# Altium schematic symbol library AA_Symbols.SchLib: 1017 symbols (part 2 of 7) (continued)
## Con_Header_50_V_SHRD_STRN-RLF_EJCT_SMT
designator P?, comment EHT-125-01-L-D-SM-SR
Connector, Header, 25x2Position, Vertical, Shrowded, Strain Relief, Eject Hooks, Surface Mount; Manufacturer: Samtec; Outset P/N: PN-0001709; Value: EHT-125-01-L-D-SM-SR; Manufacturer P/N: EHT-125-01-L-D-SM-SR
footprint EHT-125-01-L-D-SM-SR-LC_2mm2x25pin (Connector, Header, 25x2Position, Vertical, Shrowded, Eject Hooks, Surface Mount)
footprint EHT-125-01-L-D-SM-SR_2mm2x25pin (Connector, Header, 25x2Position, Vertical, Shrowded, Eject Hooks, Surface Mount)
pins: 1, 2, 3, 4, 5, 6, 7, 8, 9, 10, 11, 12, 13, 14, 15, 16, 17, 18, 19, 20, 21, 22, 23, 24, 25, 26, 27, 28, 29, 30, 31, 32, 33, 34, 35, 36, 37, 38, 39, 40, 41, 42, 43, 44, 45, 46, 47, 48, 49, 50

## Con_MicroClasp_Dual_8_V_Thru
designator J?, comment 55917-0810
Connector, MicroClasp, Dual Row, 8 Position, Vertical, Through Hole; Manufacturer: Molex; Outset P/N: 0000056; Manufacturer P/N: 55917-0810
footprint 55917-0810 (Connector, MicroClasp, Dual Row, 8 Position, Vertical, Through Hole)
pins: 1, 2, 3, 4, 5, 6, 7, 8

## Con_MicroClasp_Dual_10_V_Thru
designator J?, comment 55917-1010
Connector, MicroClasp, Dual Row, 10 Position, Vertical, Through Hole; Manufacturer: Molex; Outset P/N: 0000049; Manufacturer P/N: 55917-1010
footprint 55917-1010 (Connector, MicroClasp, Dual Row, 10 Position, Vertical, Through Hole)
pins: 1, 2, 3, 4, 5, 6, 7, 8, 9, 10

## Con_MicroClasp_Dual_14_V_Thru
designator J?, comment 55917-1410
Connector, MicroClasp, Dual Row, 14 Position, Vertical, Through Hole; Manufacturer: Molex; Outset P/N: 0000050; Manufacturer P/N: 55917-1410
footprint 55917-1410 (Connector, MicroClasp, Dual Row, 14 Position, Vertical, Through Hole)
pins: 1, 2, 3, 4, 5, 6, 7, 8, 9, 10, 11, 12, 13, 14

## Con_MicroClasp_Dual_18_V_Thru
designator J?, comment 55917-1810
Connector, MicroClasp, Dual Row, 18 Position, Vertical, Through Hole; Manufacturer: Molex; Outset P/N: 0000051; Manufacturer P/N: 55917-1810
footprint 55917-1810 (Connector, MicroClasp, Dual Row, 18 Position, Vertical, Through Hole)
pins: 1, 2, 3, 4, 5, 6, 7, 8, 9, 10, 11, 12, 13, 14, 15, 16, 17, 18

## Con_MicroClasp_Dual_20_V_Thru
designator J?, comment 55917-2010
Connector, MicroClasp, Dual Row, 20 Position, Vertical, Through Hole; Manufacturer: Molex; Outset P/N: 0000052; Manufacturer P/N: 55917-2010
footprint 55917-2010 (Connector, MicroClasp, Dual Row, 20 Position, Vertical, Through Hole)
pins: 1, 2, 3, 4, 5, 6, 7, 8, 9, 10, 11, 12, 13, 14, 15, 16, 17, 18, 19, 20

## Con_MicroClasp_Dual_28_V_Thru
designator J?, comment 55917-2810
Connector, MicroClasp, Dual Row, 28 Position, Vertical, Through Hole; Manufacturer: Molex; Outset P/N: 0000053; Manufacturer P/N: 55917-2810
footprint 55917-2810 (Connector, MicroClasp, Dual Row, 28 Position, Vertical, Through Hole)
pins: 1, 2, 3, 4, 5, 6, 7, 8, 9, 10, 11, 12, 13, 14, 15, 16, 17, 18, 19, 20, 21, 22, 23, 24, 25, 26, 27, 28

## Con_MicroClasp_Dual_34_V_Thru
designator J?, comment 55917-3410
Connector, MicroClasp, Dual Row, 34 Position, Vertical, Through Hole; Manufacturer: Molex; Outset P/N: 0000054; Manufacturer P/N: 55917-3410
footprint 55917-3410 (Connector, MicroClasp, Dual Row, 34 Position, Vertical, Through Hole)
pins: 1, 2, 3, 4, 5, 6, 7, 8, 9, 10, 11, 12, 13, 14, 15, 16, 17, 18, 19, 20, 21, 22, 23, 24, 25, 26, 27, 28, 29, 30, 31, 32, 33, 34

## Con_MicroClasp_Dual_40_V_Thru
designator J?, comment 55917-4010
Connector, MicroClasp, Dual Row, 40 Position, Vertical, Through Hole; Manufacturer: Molex; Outset P/N: 0000055; Manufacturer P/N: 55917-4010
footprint 55917-4010 (Connector, MicroClasp, Dual Row, 40 Position, Vertical, Through Hole)
pins: 1, 2, 3, 4, 5, 6, 7, 8, 9, 10, 11, 12, 13, 14, 15, 16, 17, 18, 19, 20, 21, 22, 23, 24, 25, 26, 27, 28, 29, 30, 31, 32, 33, 34, 35, 36, 37, 38, 39, 40

## Con_MicroFit_2_RA_Thru
designator J?, comment 43045-0201
Connector, Micro-Fit, 2 Position, Right Angle, Through Hole; Manufacturer: Molex; Outset P/N: 0000061; Manufacturer P/N: 43045-0201
footprint 43045-0201
pins: 1, 2

## Con_MicroFit_2_V_Thru
designator J?, comment 43045-0228
Connector, Micro-Fit, 2 Position, Vert, Through Hole; Manufacturer: Molex; Outset P/N: 0000062; Manufacturer P/N: 43045-0228
footprint 43045-0228 (Conn, 2-Pin, Vertical Thru-hole, Molex Micro-Fit)
pins: 1, 2

## Con_MicroFit_4_RA_Thru
designator J?, comment 43045-0401
Connector, Micro-Fit, 4 Position, Right Angle, Through Hole; Manufacturer: Molex; Outset P/N: 0000063; Manufacturer P/N: 43045-0401
footprint 43045-0401 (Conn, 4-Pin, Right Angle, Thru-hole, Molex Micro-Fit)
pins: 1, 2, 3, 4

## Con_MicroFit_4_V_SMT
designator J?, comment 43045-0419
Connector, Micro-Fit, 4 Position, Vertical, SMT; Manufacturer: Molex; Outset P/N: 0000064; Manufacturer P/N: 43045-0419
footprint 43045-0419 (Conn, 4-Pin, Vertical, SMT, Molex Micro-Fit)
pins: 1, 2, 3, 4

## Con_MicroFit_4_V_Thru
designator J?, comment 43045-0428
Connector, Micro-Fit, 4 Position, Vertical, Through Hole; Manufacturer: Molex; Outset P/N: 0000065; Manufacturer P/N: 43045-0428
footprint 43045-0428 (Conn, 4-Pin, Vertical Thru-hole, Molex Micro-Fit)
pins: 1, 2, 3, 4

## Con_MicroFit_6_RA_Thru
designator J?, comment 43045-0601
Connector, Micro-Fit, 6 Position, Right Angle, Through Hole; Manufacturer: Molex; Outset P/N: 0000066; Manufacturer P/N: 43045-0601
footprint 43045-0601 (Conn, 6-Pin, Right Angle, Thru-hole, Molex Micro-Fit)
pins: 1, 2, 3, 4, 5, 6

## Con_MicroFit_6_V_Thru
designator J?, comment 43045-0628
Connector, Micro-Fit, 6 Position, Vertical, Through Hole; Manufacturer: Molex; Outset P/N: 0000067; Manufacturer P/N: 43045-0628
footprint 43045-0628 (Conn, 6-Pin, Vertical, Molex Micro-Fit)
pins: 1, 2, 3, 4, 5, 6

## Con_MicroFit_8_RA_Thru
designator J?, comment 43045-0801
Connector, Micro-Fit, 8 Position, Right Angle, Through Hole; Manufacturer: Molex; Outset P/N: 0000068; Manufacturer P/N: 43045-0801
footprint 43045-0801 (Conn, 8-Pin, Right Angle, Thru-hole, Molex Micro-Fit)
pins: 1, 2, 3, 4, 5, 6, 7, 8

## Con_MicroFit_10_RA_Thru
designator J?, comment 43045-1001
Connector, Micro-Fit, 10 Position, Right Angle, Through Hole; Manufacturer: Molex; Outset P/N: 0000057; Manufacturer P/N: 43045-1001
footprint 43045-1001 (Conn, 10-Pin, Right Angle, Thru-hole, Molex Micro-Fit)
pins: 1, 2, 3, 4, 5, 6, 7, 8, 9, 10

## Con_MicroFit_10_V_Thru
designator J?, comment 43045-1028
Connector, Micro-Fit, 10 Position, Vertical, Through Hole; Manufacturer: Molex; Outset P/N: 0000058; Manufacturer P/N: 43045-1028
footprint 43045-1028 (Conn, 10-Pin, Right Angle, Vertical, Molex Micro-Fit)
pins: 1, 2, 3, 4, 5, 6, 7, 8, 9, 10

## Con_MicroFit_Single_6_V_Thru
designator J?, comment 43650-0628
Connector, Micro-Fit, Single Row, 6 Position, Vertical, Through Hole; Manufacturer: Molex; Outset P/N: 0000069; Manufacturer P/N: 43650-0628
footprint 43650-0628 (Conn, 6-Pin, Single Row, Vertical, Molex Micro-Fit)
pins: 1, 2, 3, 4, 5, 6

## Con_microSD_8_HINGE
designator J?, comment 5009010801
Connector, microSD Memory Card Connector, 8 Positions, Hinge Style; Manufacturer: Molex; Outset P/N: PN-0001737; Manufacturer P/N: 5009010801; Value: 5009010801
footprint 5009010801_microSD_8pin (Footprint not found)
pins: 1 DAT2, 2 CD/DAT3, 3 CMD, 4 VDD, 5 CLK, 6 GND, 7 DAT0, 8 DAT1, 9 SHELL1, 10 SHELL2, 11 SHELL3, 12 SHELL4
text: LOCK; microSD card / topside; OPEN

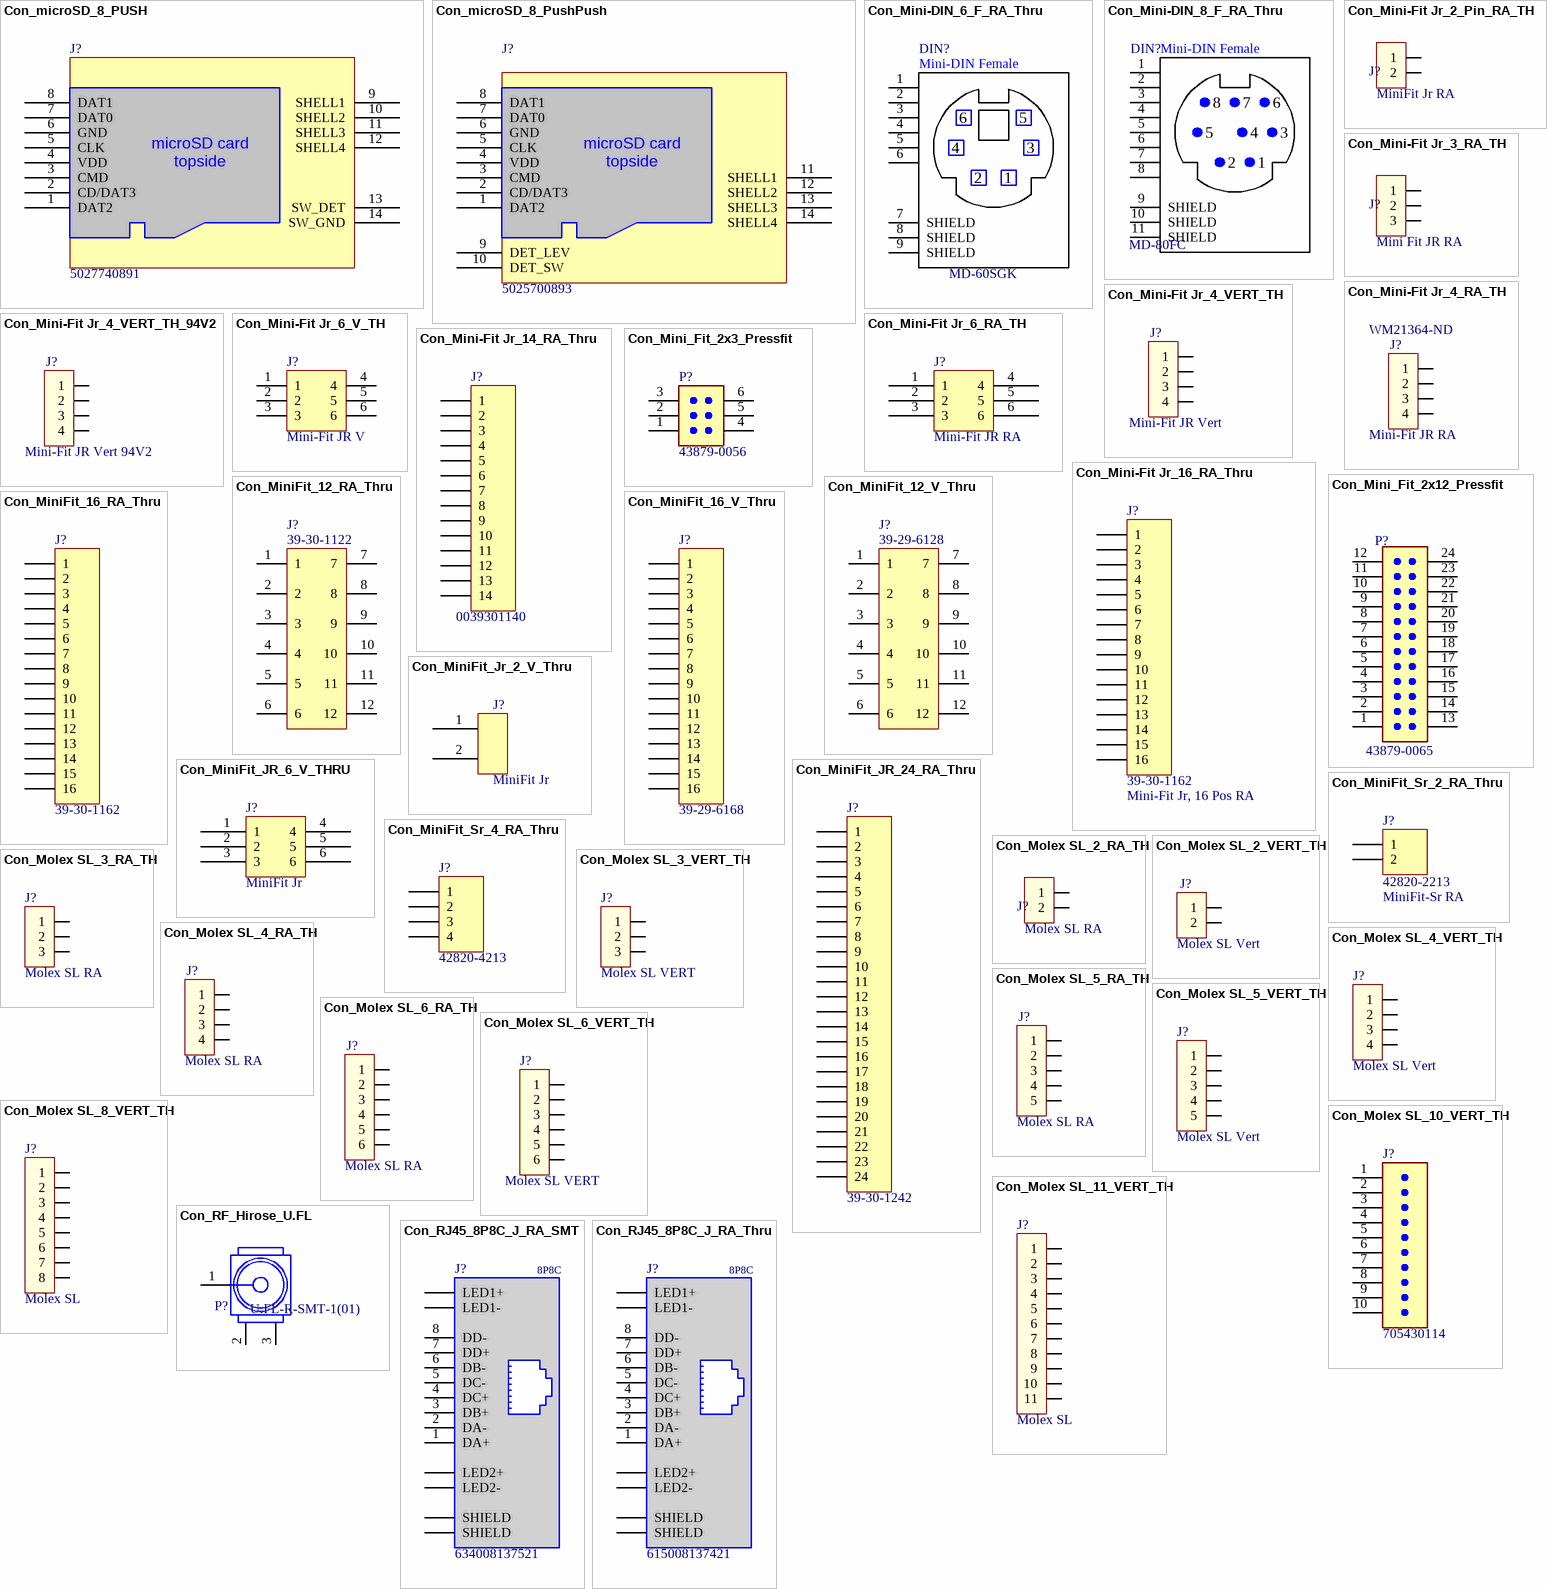
[diagram p9: symbols Con_microSD_8_PUSH to Con_RJ45_8P8C_J_RA_Thru]

## Con_microSD_8_PUSH
designator J?, comment 5027740891
Connector, microSD Memory Card Connector, 8 Positions, Hinge Style; Manufacturer PN: 5027740891; Value: 5027740891
footprint CONN_SD_5027740891 (ONN MICRO SD CARD PUSH-PUSH R/A)
pins: 1 DAT2, 2 CD/DAT3, 3 CMD, 4 VDD, 5 CLK, 6 GND, 7 DAT0, 8 DAT1, 9 SHELL1, 10 SHELL2, 11 SHELL3, 12 SHELL4, 13 SW_DET, 14 SW_GND
text: microSD card / topside

## Con_microSD_8_PushPush
designator J?, comment 5025700893
Connector, microSD Memory Card Connector, 8 Positions, Push-Push; Manufacturer: Molex; Manufacturer P/N: 5025700893; Value: 5025700893
footprint 5025700893_microSD_8pin
pins: 1 DAT2, 2 CD/DAT3, 3 CMD, 4 VDD, 5 CLK, 6 GND, 7 DAT0, 8 DAT1, 9 DET_LEV, 10 DET_SW, 11 SHELL1, 12 SHELL2, 13 SHELL3, 14 SHELL4
text: microSD card / topside

## Con_Mini-DIN_6_F_RA_Thru
designator DIN?, comment MD-60SGK
Connector, Mini DIN, 6 Positions, Female, Right Angle, Through Hole; Manufacturer: CUI; Outset P/N: PN-0001674; Manufacturer P/N: MD-60SGK; Value: MD-60SGK
footprint MD-60SGK_2.6mm6pin (CUI Mini-DIN 6 Poisition,  Female, Shielded, Right Angle)
pins: 1, 2, 3, 4, 5, 6, 7 SHIELD, 8 SHIELD, 9 SHIELD
text: Mini-DIN Female

## Con_Mini-DIN_8_F_RA_Thru
designator DIN?, comment MD-80FC
Connector, Mini DIN, 8 Positions, Female, Right Angle, Through Hole; Manufacturer: CUI; Outset P/N: PN-0001627; Manufacturer P/N: MD-80FC; Value: MD-80FC
footprint MD-80FC_2.6mm8pin (MD-80FC, Mini-DIN 8 Poisition Connector, Female, Right Angle)
pins: 1, 2, 3, 4, 5, 6, 7, 8, 9 SHIELD, 10 SHIELD, 11 SHIELD
text: Mini-DIN Female

## Con_Mini-Fit Jr_2_Pin_RA_TH
designator J?, comment MiniFit Jr RA
Connector, Mini-Fit Jr, 2 Pin, Right Angle, Thru-Hole; Manufacturer: Molex; Manufacturer P/N: 0039301022; Outset P/N: PN-0002158; Supplier 1: Digi-Key; Supplier Part Number 1: WM21363-ND; Value: MiniFit Jr RA
footprint 39-30-1022 (Footprint not found)
pins: 1, 2

## Con_Mini-Fit Jr_3_RA_TH
designator J?, comment Mini Fit JR RA
Connector, Mini-Fit Jr, 3 Pin_Right Angle, Thru-Hole; Manufacturer: Molex; Manufacturer P/N: 0039303038; Outset P/N: PN-0002160; Supplier 1: Digi-Key; Supplier Part Number 1: WM4273-ND; Value: Mini Fit JR RA
footprint 39-30-3038 (Footprint not found)
pins: 1, 2, 3

## Con_Mini-Fit Jr_4_RA_TH
designator J?, comment Supplier Part Number 1: WM21364-ND  (hidden comment: Mini-Fit JR RA)
Connector, Mini-Fit Jr, 4 Pin, Right Angle, Thru-Hole; Manufacturer: Molex; Manufacturer P/N: 0039301042; Outset P/N: PN-0002984; Supplier 1: Digi-Key; Value: Mini-Fit JR RA
footprint 39-30-1042 (4 Positions Header, Shrouded Connector 0.165" (4.20mm) Through Hole Gold)
pins: 1, 2, 3, 4

## Con_Mini-Fit Jr_4_VERT_TH
designator J?, comment Mini-Fit JR Vert
Connector, Mini-Fit Jr, 4 Pin, Vertical, Thru-Hole; Manufacturer: Molex; Manufacturer P/N: 0039299049; Outset P/N: PN-0002161; Supplier 1: Digi-Key; Supplier Part Number 1: -; Value: Mini-Fit JR Vert
footprint 39-29-9049 (4 Positions Header, Shrouded Connector 0.165" (4.20mm) Through Hole Gold)
pins: 1, 2, 3, 4

## Con_Mini-Fit Jr_4_VERT_TH_94V2
designator J?, comment Mini-Fit JR Vert 94V2
Connector, Mini-Fit Jr, 4 Pin, Vertical, Thru-Hole 94V2; Manufacturer: Molex; Manufacturer P/N: 0039299044; Outset P/N: PN-0001800; Supplier 1: Digi-Key; Supplier Part Number 1: -; Value: Mini-Fit JR Vert 94V2
footprint 39-29-9049 (4 Positions Header, Shrouded Connector 0.165" (4.20mm) Through Hole Gold)
pins: 1, 2, 3, 4

## Con_Mini-Fit Jr_6_RA_TH
designator J?, comment Mini-Fit JR RA
Connector, Mini-Fit Jr, 6 Pin, Right Angle, Thru-Hole; Manufacturer: Molex; Manufacturer P/N: 0039301062; Outset P/N: PN-0002162; Supplier 1: Digi-Key; Supplier Part Number 1: WM21365-ND; Value: Mini-Fit JR RA
footprint 39-30-1062 (MiniFit Jr 6 pin RA)
pins: 1, 2, 3, 4, 5, 6

## Con_Mini-Fit Jr_6_V_TH
designator J?, comment Mini-Fit JR V
Connector, Mini-Fit Jr, 6 Pin, Right Angle, Thru-Hole; Manufacturer: Molex; Manufacturer P/N: 0462070206; Supplier 1: Digi-Key; Supplier Part Number 1: 0462070206-ND; Value: Mini-Fit JR V
footprint CONN_TH_MOLEX_0462070206 (Molex Mini-Fit Jr High-Temp, Vertical, 2x3-pin, 4.2mm pitch, with mounting tabs)
pins: 1, 2, 3, 4, 5, 6

## Con_Mini-Fit Jr_14_RA_Thru
designator J?, comment value 0039301140  (hidden comment: 39-30-1140)
Connector, Mini-Fit Jr, 14 Position, Right Angle, Through Hole; Manufacturer: Molex; Outset P/N: PN-0007482; Distributor: Digi-Key; Distributor P/N: WM1357-ND; Manufacturer P/N: 0039301140; Supplier 1: Digi-Key; Supplier Part Number 1: WM1357-ND
footprint 39-30-1140
pins: 1, 2, 3, 4, 5, 6, 7, 8, 9, 10, 11, 12, 13, 14

## Con_Mini-Fit Jr_16_RA_Thru
designator J?, comment 39-30-1162  value Mini-Fit Jr, 16 Pos RA
Connector, Mini-Fit Jr, 16 Position, Right Angle, Through Hole; Manufacturer: Molex; Outset P/N: 0000072; Distributor: Digi-Key; Distributor P/N: WM21370-ND; Manufacturer P/N: 39-30-1162; Supplier 1: Digi-Key; Supplier Part Number 1: WM21370-ND
footprint 39-30-1162
pins: 1, 2, 3, 4, 5, 6, 7, 8, 9, 10, 11, 12, 13, 14, 15, 16

## Con_Mini_Fit_2x3_Pressfit
designator P?, comment 43879-0056
Mini-Fit BMI Header , Dual Row, Vertical, 6 Circuits, Press-fit; Manufacturer: Molex; Outset P/N: PN-0001701; Manufacturer P/N: 43879-0056; Value: 43879-0056
footprint CONN_MOLEX_43879-0056 (Connector, Molex Mini-Fit BMI 2x3 Press-fit)
pins: 1, 2, 3, 4, 5, 6

## Con_Mini_Fit_2x12_Pressfit
designator P?, comment 43879-0065
Mini-Fit BMI Header , Dual Row, Vertical, 24 Circuits, Press-fit; Manufacturer: Molex; Outset P/N: PN-0001702; Manufacturer P/N: 43879-0065; Value: 43879-0065
footprint CONN_MOLEX_43879-0065 (Connector, Molex Mini-Fit BMI 2x12 Press-fit)
pins: 1, 2, 3, 4, 5, 6, 7, 8, 9, 10, 11, 12, 13, 14, 15, 16, 17, 18, 19, 20, 21, 22, 23, 24

## Con_MiniFit_12_RA_Thru
designator J?, comment 39-30-1122
Connector, Mini-Fit, 12 Position, Right Angle, Through Hole; Manufacturer: Molex; Outset P/N: 0000070; Manufacturer P/N: 39-30-1122
footprint CONN_MOLEX_39-30-X12X (2 X 6 PINS)
pins: 1, 2, 3, 4, 5, 6, 7, 8, 9, 10, 11, 12

## Con_MiniFit_12_V_Thru
designator J?, comment 39-29-6128
Connector, Mini-Fit, 12 Position, Vertical, Through Hole; Manufacturer: Molex; Outset P/N: 0000071; Manufacturer P/N: 39-29-6128
footprint CONN_MOLEX_39-29-6128 (Mini Fit JR, Vertical, 2 X 6 PINS)
pins: 1, 2, 3, 4, 5, 6, 7, 8, 9, 10, 11, 12

## Con_MiniFit_16_RA_Thru
designator J?, comment 39-30-1162
Connector, Mini-Fit, 16 Position, Right Angle, Through Hole; Manufacturer: Molex; Outset P/N: 0000072; Manufacturer P/N: 39-30-1162
footprint 26-01-3108
pins: 1, 2, 3, 4, 5, 6, 7, 8, 9, 10, 11, 12, 13, 14, 15, 16

## Con_MiniFit_16_V_Thru
designator J?, comment 39-29-6168
Connector, Mini-Fit Jr, 16 Position, Vertical, Through Hole; Manufacturer: Molex; Outset P/N: 0000073; Manufacturer P/N: 39-29-6168
footprint 039296168 (CONN HEADER MiniFit JR 16POS 4.2MM VERT GOL)
pins: 1, 2, 3, 4, 5, 6, 7, 8, 9, 10, 11, 12, 13, 14, 15, 16

## Con_MiniFit_Jr_2_V_Thru
designator J?, comment MiniFit Jr
Con, MiniFit-Jr, 2 Pin, Vert, Thru; Manufacturer: Molex; Outset P/N: 0000076; Manufacturer P/N: 39-29-9025
footprint Conn_2_Pin_Vert_Mini-Jr (MiniFit Jr 2 pin Vert)
pins: 1, 2

## Con_MiniFit_JR_6_V_THRU
designator J?, comment MiniFit Jr
Con, MiniFit Jr, 6 pins, Vert, Thru, 8A; Manufacturer: Molex; Outset P/N: 0000075; Manufacturer P/N: 39-29-0063
footprint CONN 6 PIN VERT MINI-JR
pins: 1, 2, 3, 4, 5, 6

## Con_MiniFit_JR_24_RA_Thru
designator J?, comment 39-30-1242
Connector, Mini-Fit JR, 24 Position, Right Angle, Through Hole; Manufacturer: Molex; Outset P/N: 0000074; Manufacturer P/N: 39-30-1242
footprint CONN_24_PIN_RA_MINIFIT-JR
pins: 1, 2, 3, 4, 5, 6, 7, 8, 9, 10, 11, 12, 13, 14, 15, 16, 17, 18, 19, 20, 21, 22, 23, 24

## Con_MiniFit_Sr_2_RA_Thru
designator J?, comment 42820-2213  value MiniFit-Sr RA
Connector, Mini-Fit Sr., 2 Position, Right Angle, Through Hole; Manufacturer: Molex; Outset P/N: 0000077; Manufacturer P/N: 42820-2213
footprint CON_2_RA_MiniFit_SR
pins: 1, 2

## Con_MiniFit_Sr_4_RA_Thru
designator J?, comment 42820-4213
Connector, Mini-Fit Sr., 4 Position, Right Angle, Through Hole; Manufacturer: Molex; Outset P/N: PN-0003041; Value: MiniFit-Sr RA; Supplier 1: Digi-Key; Supplier Part Number 1: WM10847-ND; Manufacturer P/N: 42820-4213
footprint 42820-4213 (CONN_4_RA_MiniFit_SR)
pins: 1, 2, 3, 4

## Con_Molex SL_2_RA_TH
designator J?, comment Molex SL RA
Connector, Molex SL, 2 Pin, Right Angle, Thru-Hole; Manufacturer P/N: 0705530001; Outset P/N: PN-0002164; Supplier 1: Digi-Key; Supplier Part Number 1: WM4900-ND; Manufacturer: Molex; Value: Molex SL RA
footprint 70553-0001 (Footprint not found)
pins: 1, 2

## Con_Molex SL_2_VERT_TH
designator J?, comment Molex SL Vert
Connector, Molex SL, 2 Pin, Vertical, Thru-Hole; Manufacturer P/N: 0705430106; Outset P/N: PN-0002165; Supplier 1: Digi-Key; Supplier Part Number 1: WM4122-ND; Manufacturer: Molex; Value: Molex SL Vert
footprint 70543-0106
pins: 1, 2

## Con_Molex SL_3_RA_TH
designator J?, comment Molex SL RA
Connector, Molex SL, 3 Pin, Vertical, Thru-Hole; Manufacturer P/N: 705530107; Outset P/N: PN-0002166; Supplier 1: Digi-Key; Supplier Part Number 1: WM4123-ND; Manufacturer: Molex; Value: Molex SL RA
footprint 70553-0107
pins: 1, 2, 3

## Con_Molex SL_3_VERT_TH
designator J?, comment Molex SL VERT
Connector, Molex SL, 3 Pin, Vertical, Thru-Hole; Manufacturer P/N: 0705430107; Outset P/N: PN-0002167; Supplier 1: Digi-Key; Supplier Part Number 1: WM4123-ND; Manufacturer: Molex; Value: Molex SL VERT
footprint 70543-0107
pins: 1, 2, 3

## Con_Molex SL_4_RA_TH
designator J?, comment Molex SL RA
Connector, Molex SL, 4 Pin, Right Angle, Thru-Hole; Manufacturer P/N: 705530108; Outset P/N: PN-0002168; Supplier 1: Digi-Key; Supplier Part Number 1: WM4155-ND; Manufacturer: Molex; Value: Molex SL RA
footprint 70553-0108
pins: 1, 2, 3, 4

## Con_Molex SL_4_VERT_TH
designator J?, comment Molex SL Vert
Connector, Molex SL, 4 Pin, Vertical, Thru-Hole; Manufacturer P/N: 0705430108; Outset P/N: PN-0002169; Supplier 1: Digi-Key; Supplier Part Number 1: WM4124-ND; Manufacturer: Molex; Value: Molex SL Vert
footprint 70543-0108
pins: 1, 2, 3, 4

## Con_Molex SL_5_RA_TH
designator J?, comment Molex SL RA
Connector, Molex SL, 5 Pin, Right Angle, Thru-Hole; Manufacturer P/N: 70553-0109; Outset P/N: PN-0002170; Manufacturer: Molex; Supplier 2: Element14; Supplier Part Number 2: 1450538; Value: Molex SL RA
footprint 70553-0109 (SL, 5pos, R/A, TH)
pins: 1, 2, 3, 4, 5

## Con_Molex SL_5_VERT_TH
designator J?, comment Molex SL Vert
Connector, Molex SL, 5 Pin, Vertical, Thru-Hole; Manufacturer P/N: 0705430109; Outset P/N: PN-0002171; Supplier 1: Digi-Key; Supplier Part Number 1: WM4125-ND; Manufacturer: Molex; Value: Molex SL Vert
footprint 70543-0109
pins: 1, 2, 3, 4, 5

## Con_Molex SL_6_RA_TH
designator J?, comment value Molex SL RA  (hidden comment: 70553-0110)
Connector, Molex SL, 6 Pin, Right Angle, Thru-Hole; Outset P/N: PN-0004065; Manufacturer: Molex; Manufacturer P/N: 70553-0110; Supplier 1: Digi-Key; Supplier Part Number 1: WM4157-ND
footprint 70553-0110 (SL, 6pos, R/A, TH)
pins: 1, 2, 3, 4, 5, 6

## Con_Molex SL_6_VERT_TH
designator J?, comment Molex SL VERT
Connector, Molex SL, 6 Pin, Vertical, Thru-Hole; Manufacturer P/N: 0705430110; Outset P/N: PN-0002173; Supplier 1: Digi-Key; Supplier Part Number 1: WM4126-ND; Manufacturer: Molex; Value: Molex SL VERT
footprint 70543-0110
pins: 1, 2, 3, 4, 5, 6

## Con_Molex SL_8_VERT_TH
designator J?, comment Molex SL
Connector, Molex SL, 8 Pin, Vertical, Thru-Hole; Manufacturer P/N: 0705430112; Outset P/N: PN-0002175; Value: Molex SL; Supplier 1: Digi-Key; Supplier Part Number 1: WM4128-ND; Manufacturer: Molex
footprint 70543-0112
pins: 1, 2, 3, 4, 5, 6, 7, 8

## Con_Molex SL_10_VERT_TH
designator J?, comment 705430114
CONN HEADER VERT 10POS 2.54MM, Molex SL; Outset P/N: PN-0007206; VALUE: 705430114; Manufacturer: Molex; Manufacturer P/N: 705430114
footprint CONN_TH_MOLEX_705430114 (Footprint not found)
pins: 1, 2, 3, 4, 5, 6, 7, 8, 9, 10

## Con_Molex SL_11_VERT_TH
designator J?, comment Molex SL
Connector, Molex SL, 11 Pin, Vertical, Thru-Hole; Manufacturer P/N: 70543-0115; Outset P/N: PN-0002176; Value: Molex SL; Supplier 1: Digi-Key; Supplier Part Number 1: WM4131-ND; Manufacturer: Molex
footprint 70543-0115
pins: 1, 2, 3, 4, 5, 6, 7, 8, 9, 10, 11

## Con_RF_Hirose_U.FL
designator P?, comment U.FL-R-SMT-1(01)
U.FL (UMCC) Connector Receptacle, Male Pin 50Ohm SMT; Manufacturer: Hirose; Outset P/N: PN-0007430; Value: U.FL-R-SMT-1(01); Manufacturer P/N: U.FL-R-SMT-1(01)
footprint CONN_RF_U.FL-R-SMT-1_HIROSE_MFR (U.FL (UMCC) Connector Receptacle, Male Pin 50Ohm Surface Mount Solder)
pins: 1, 2, 3

## Con_RJ45_8P8C_J_RA_SMT
designator J?, comment 634008137521
Connector, RJ45 Ethernet, 8 Position 8 Contact, Jack, Right Angle, Surface Mount; Manufacturer: Wurth Electronics; Outset P/N: PN-0001756; Manufacturer P/N: 634008137521; Value: 634008137521
footprint 634008137521_8P8C (Footprint not found)
pins: 1 DA+, 2 DA-, 3 DB+, 4 DC+, 5 DC-, 6 DB-, 7 DD+, 8 DD-, 9 SHIELD, 10 SHIELD, LED1+, LED1-, LED2+, LED2-
text: 8P8C

## Con_RJ45_8P8C_J_RA_Thru
designator J?, comment 615008137421
Connector, RJ45 Ethernet, 8 Position 8 Contact, Jack, Right Angle, Through Hole; Manufacturer: Wurth Electronics; Outset P/N: PN-0001628; Manufacturer P/N: 615008137421; Value: 615008137421
footprint 615008137421_8P8C (Footprint not found)
pins: 1 DA+, 2 DA-, 3 DB+, 4 DC+, 5 DC-, 6 DB-, 7 DD+, 8 DD-, 9 SHIELD, 10 SHIELD, LED1+, LED1-, LED2+, LED2-
text: 8P8C

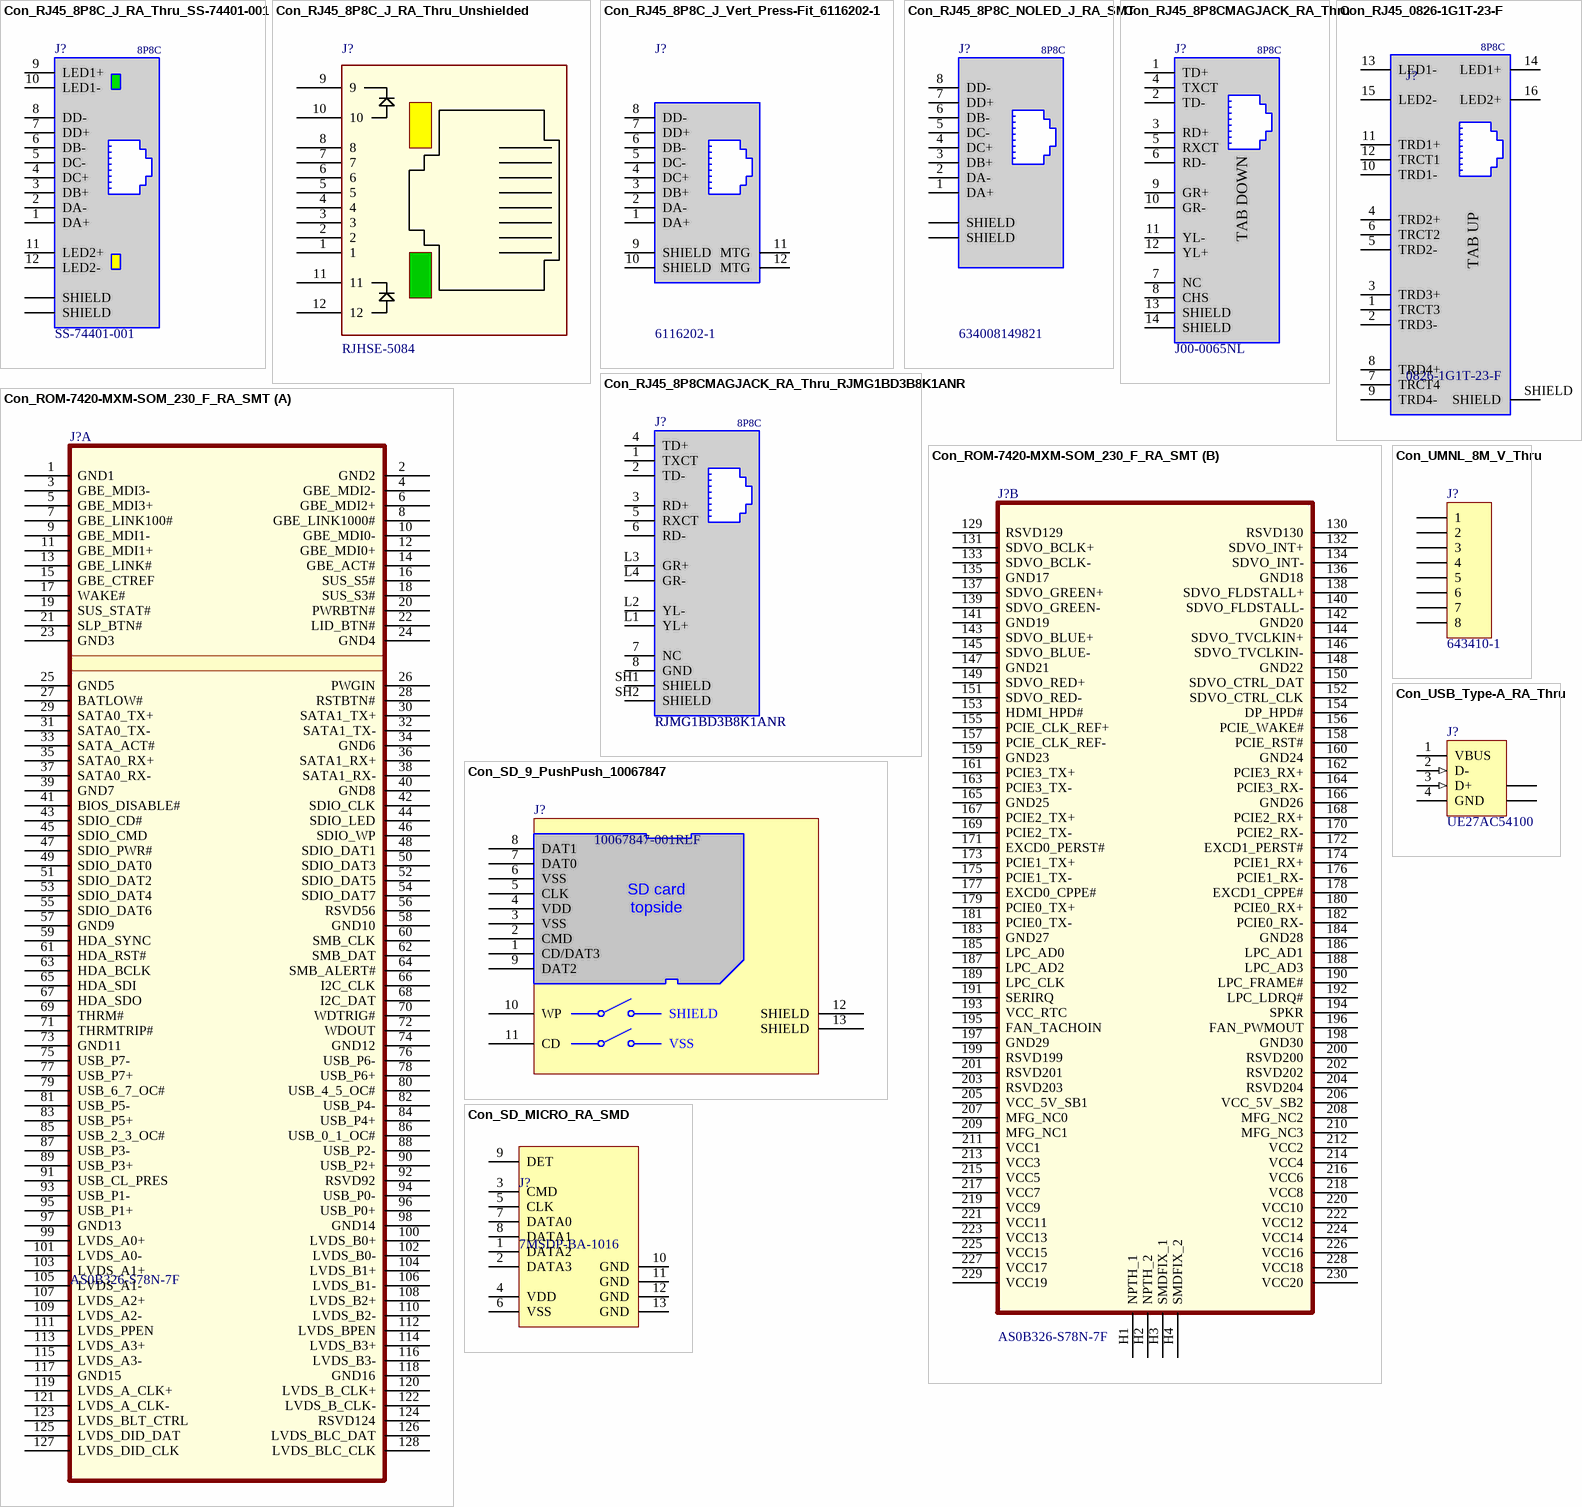
[diagram p10: symbols Con_RJ45_8P8C_J_RA_Thru_SS-74401-001 to Con_USB_Type-A_RA_Thru]

## Con_RJ45_8P8C_J_RA_Thru_SS-74401-001
designator J?, comment SS-74401-001
Connector, Jack Modular Connector 8p8c (RJ45, Ethernet) 90° Angle (Right) Shielded, EMI Finger; Manufacturer: Stewart Connector; Manufacturer P/N: SS-74401-001; Value: SS-74401-001
pins: 1 DA+, 2 DA-, 3 DB+, 4 DC+, 5 DC-, 6 DB-, 7 DD+, 8 DD-, 9 LED1+, 9 SHIELD, 10 LED1-, 10 SHIELD, 11 LED2+, 12 LED2-
text: 8P8C

## Con_RJ45_8P8C_J_RA_Thru_Unshielded
designator J?, comment RJHSE-5084
Connector, Modular Jack, RA, 8P8C, YLW/GRN, RJ45 Ethernet, Unshielded; Manufacturer: Amphenol; Outset P/N: PN-0007155; Manufacturer P/N: RJHSE-5084; VALUE: RJHSE-5084
footprint CONN_RJHSE-5084
pins: 1, 2, 3, 4, 5, 6, 7, 8, 9, 10, 11, 12

## Con_RJ45_8P8C_J_Vert_Press-Fit_6116202-1
designator J?, comment 6116202-1
Connector, RJ45 Ethernet, 8P/8C, Jack, Vert, Press-Fit; Manufacturer: TE; Outset P/N: PN-0003735; Manufacturer P/N: 6116202-1; Value: 6116202-1; Supplier 1: Digi-Key; Supplier Part Number 1: A97702-ND
footprint CON_RJ45_6116202-1 (Footprint not found)
pins: 1 DA+, 2 DA-, 3 DB+, 4 DC+, 5 DC-, 6 DB-, 7 DD+, 8 DD-, 9 SHIELD, 10 SHIELD, 11 MTG, 12 MTG

## Con_RJ45_8P8C_NOLED_J_RA_SMT
designator J?, comment 634008149821
Connector, RJ45 Ethernet, 8 Position 8 Contact, No LEDs, Jack, Right Angle, Surface Mount; Manufacturer: Wurth Electronics; Outset P/N: PN-0001760; Manufacturer P/N: 634008149821; Value: 634008149821
footprint 634008149821_8P8C (Footprint not found)
pins: 1 DA+, 2 DA-, 3 DB+, 4 DC+, 5 DC-, 6 DB-, 7 DD+, 8 DD-, 9 SHIELD, 10 SHIELD
text: 8P8C

## Con_RJ45_8P8CMAGJACK_RA_Thru
designator J?, comment J00-0065NL
Connector, RJ45 Ethernet, 8P8C, TabDown, MagJack, Right Angle, Through Hole; Manufacturer: Pulse; Outset P/N: PN-0001780; Manufacturer P/N: J00-0065NL; Value: J00-0065NL
footprint J00-0065NL (RJ45 8P8C Connector Tab-Down, Right Angle, Through Hole)
pins: 1 TD+, 2 TD-, 3 RD+, 4 TXCT, 5 RXCT, 6 RD-, 7 NC, 8 CHS, 9 GR+, 10 GR-, 11 YL-, 12 YL+, 13 SHIELD, 14 SHIELD
text: 8P8C; TAB DOWN

## Con_RJ45_8P8CMAGJACK_RA_Thru_RJMG1BD3B8K1ANR
designator J?, comment RJMG1BD3B8K1ANR
Connector, 1 Port RJ45Through Hole 10/100 Base-T, AutoMDIX; Manufacturer: Amphenol ICC (Commercial Products); Outset P/N: PN-0008197; Manufacturer P/N: RJMG1BD3B8K1ANR; Value: RJMG1BD3B8K1ANR
footprint CONN_RJMG1BD3B8K1ANR
pins: 1 TXCT, 2 TD-, 3 RD+, 4 TD+, 5 RXCT, 6 RD-, 7 NC, 8 GND, L1 YL+, L2 YL-, L3 GR+, L4 GR-, SH1 SHIELD, SH2 SHIELD
text: 8P8C

## Con_RJ45_0826-1G1T-23-F
designator J?, comment 0826-1G1T-23-F
Connector, 1 Port RJ45Through Hole 10/100/1000 Base-T, AutoMDIX; Manufacturer: Bel Fuse Inc.; Manufacturer P/N: 0826-1G1T-23-F; Value: 0826-1G1T-23-F
pins: 1 TRCT3, 2 TRD3-, 3 TRD3+, 4 TRD2+, 5 TRD2-, 6 TRCT2, 7 TRCT4, 8 TRD4+, 9 TRD4-, 10 TRD1-, 11 TRD1+, 12 TRCT1, 13 LED1-, 14 LED1+, 15 LED2-, 16 LED2+, SHIELD
text: 8P8C; TAB UP

## Con_ROM-7420-MXM-SOM_230_F_RA_SMT
designator J?, comment AS0B326-S78N-7F
Connector, Advantech ROM-7420 MXM System On Module, Card Receptacle, 230 Position, Female, Right Angle, Surface Mount; Manufacturer: Foxconn; Outset P/N: PN-0001629; Manufacturer P/N: AS0B326-S78N-7F; Value: AS0B326-S78N-7F
footprint AS0B326-S78N-7F_0.5mm230pin (AS0B326-S78N-7F, MXM Socket, Locking Clip, Right Angle, 2-Row, Pitch 0.5mm, 230-Position)
part A pins: 1 GND1, 2 GND2, 3 GBE_MDI3-, 4 GBE_MDI2-, 5 GBE_MDI3+, 6 GBE_MDI2+, 7 GBE_LINK100#, 8 GBE_LINK1000#, 9 GBE_MDI1-, 10 GBE_MDI0-, 11 GBE_MDI1+, 12 GBE_MDI0+, 13 GBE_LINK#, 14 GBE_ACT#, 15 GBE_CTREF, 16 SUS_S5#, 17 WAKE#, 18 SUS_S3#, 19 SUS_STAT#, 20 PWRBTN#, 21 SLP_BTN#, 22 LID_BTN#, 23 GND3, 24 GND4, 25 GND5, 26 PWGIN, 27 BATLOW#, 28 RSTBTN#, 29 SATA0_TX+, 30 SATA1_TX+, 31 SATA0_TX-, 32 SATA1_TX-, 33 SATA_ACT#, 34 GND6, 35 SATA0_RX+, 36 SATA1_RX+, 37 SATA0_RX-, 38 SATA1_RX-, 39 GND7, 40 GND8, 41 BIOS_DISABLE#, 42 SDIO_CLK, 43 SDIO_CD#, 44 SDIO_LED, 45 SDIO_CMD, 46 SDIO_WP, 47 SDIO_PWR#, 48 SDIO_DAT1, 49 SDIO_DAT0, 50 SDIO_DAT3, 51 SDIO_DAT2, 52 SDIO_DAT5, 53 SDIO_DAT4, 54 SDIO_DAT7, 55 SDIO_DAT6, 56 RSVD56, 57 GND9, 58 GND10, 59 HDA_SYNC, 60 SMB_CLK, 61 HDA_RST#, 62 SMB_DAT, 63 HDA_BCLK, 64 SMB_ALERT#, 65 HDA_SDI, 66 I2C_CLK, 67 HDA_SDO, 68 I2C_DAT, 69 THRM#, 70 WDTRIG#, 71 THRMTRIP#, 72 WDOUT, 73 GND11, 74 GND12, 75 USB_P7-, 76 USB_P6-, 77 USB_P7+, 78 USB_P6+, 79 USB_6_7_OC#, 80 USB_4_5_OC#, 81 USB_P5-, 82 USB_P4-, 83 USB_P5+, 84 USB_P4+, 85 USB_2_3_OC#, 86 USB_0_1_OC#, 87 USB_P3-, 88 USB_P2-, 89 USB_P3+, 90 USB_P2+, 91 USB_CL_PRES, 92 RSVD92, 93 USB_P1-, 94 USB_P0-, 95 USB_P1+, 96 USB_P0+, 97 GND13, 98 GND14, 99 LVDS_A0+, 100 LVDS_B0+, 101 LVDS_A0-, 102 LVDS_B0-, 103 LVDS_A1+, 104 LVDS_B1+, 105 LVDS_A1-, 106 LVDS_B1-, 107 LVDS_A2+, 108 LVDS_B2+, 109 LVDS_A2-, 110 LVDS_B2-, 111 LVDS_PPEN, 112 LVDS_BPEN, 113 LVDS_A3+, 114 LVDS_B3+, 115 LVDS_A3-, 116 LVDS_B3-, 117 GND15, 118 GND16, 119 LVDS_A_CLK+, 120 LVDS_B_CLK+, 121 LVDS_A_CLK-, 122 LVDS_B_CLK-, 123 LVDS_BLT_CTRL, 124 RSVD124, 125 LVDS_DID_DAT, 126 LVDS_BLC_DAT, 127 LVDS_DID_CLK, 128 LVDS_BLC_CLK
part B pins: 129 RSVD129, 130 RSVD130, 131 SDVO_BCLK+, 132 SDVO_INT+, 133 SDVO_BCLK-, 134 SDVO_INT-, 135 GND17, 136 GND18, 137 SDVO_GREEN+, 138 SDVO_FLDSTALL+, 139 SDVO_GREEN-, 140 SDVO_FLDSTALL-, 141 GND19, 142 GND20, 143 SDVO_BLUE+, 144 SDVO_TVCLKIN+, 145 SDVO_BLUE-, 146 SDVO_TVCLKIN-, 147 GND21, 148 GND22, 149 SDVO_RED+, 150 SDVO_CTRL_DAT, 151 SDVO_RED-, 152 SDVO_CTRL_CLK, 153 HDMI_HPD#, 154 DP_HPD#, 155 PCIE_CLK_REF+, 156 PCIE_WAKE#, 157 PCIE_CLK_REF-, 158 PCIE_RST#, 159 GND23, 160 GND24, 161 PCIE3_TX+, 162 PCIE3_RX+, 163 PCIE3_TX-, 164 PCIE3_RX-, 165 GND25, 166 GND26, 167 PCIE2_TX+, 168 PCIE2_RX+, 169 PCIE2_TX-, 170 PCIE2_RX-, 171 EXCD0_PERST#, 172 EXCD1_PERST#, 173 PCIE1_TX+, 174 PCIE1_RX+, 175 PCIE1_TX-, 176 PCIE1_RX-, 177 EXCD0_CPPE#, 178 EXCD1_CPPE#, 179 PCIE0_TX+, 180 PCIE0_RX+, 181 PCIE0_TX-, 182 PCIE0_RX-, 183 GND27, 184 GND28, 185 LPC_AD0, 186 LPC_AD1, 187 LPC_AD2, 188 LPC_AD3, 189 LPC_CLK, 190 LPC_FRAME#, 191 SERIRQ, 192 LPC_LDRQ#, 193 VCC_RTC, 194 SPKR, 195 FAN_TACHOIN, 196 FAN_PWMOUT, 197 GND29, 198 GND30, 199 RSVD199, 200 RSVD200, 201 RSVD201, 202 RSVD202, 203 RSVD203, 204 RSVD204, 205 VCC_5V_SB1, 206 VCC_5V_SB2, 207 MFG_NC0, 208 MFG_NC2, 209 MFG_NC1, 210 MFG_NC3, 211 VCC1, 212 VCC2, 213 VCC3, 214 VCC4, 215 VCC5, 216 VCC6, 217 VCC7, 218 VCC8, 219 VCC9, 220 VCC10, 221 VCC11, 222 VCC12, 223 VCC13, 224 VCC14, 225 VCC15, 226 VCC16, 227 VCC17, 228 VCC18, 229 VCC19, 230 VCC20, H1 NPTH_1, H2 NPTH_2, H3 SMDFIX_1, H4 SMDFIX_2

## Con_SD_9_PushPush_10067847
designator J?, comment 10067847-001RLF
Connector, SD Memory Card Connector, 9 Positions, Push-Push; Manufacturer: Amphenol FCI; Outset P/N: PN-0002773; Manufacturer P/N: 10067847-001RLF; Value: 10067847-001RLF
footprint 10067847_SD_9pin (SD Memory Card Push-Push Connector; Amphenol/FCI 10067847)
pins: 1 CD/DAT3, 2 CMD, 3 VSS, 4 VDD, 5 CLK, 6 VSS, 7 DAT0, 8 DAT1, 9 DAT2, 10 WP, 11 CD, 12 SHIELD, 13 SHIELD
text: SD card / topside

## Con_SD_MICRO_RA_SMD
designator J?, comment 7MSDP-BA-1016
Connector, Micro-SD, 8+2, Right Angle, Surface Mount; Manufacturer: KINGCONN; Manufacturer P/N: 7MSDP-BA-1016; Value: 7MSDP-BA-1016
pins: 1 DATA2, 2 DATA3, 3 CMD, 4 VDD, 5 CLK, 6 VSS, 7 DATA0, 8 DATA1, 9 DET, 10 GND, 11 GND, 12 GND, 13 GND

## Con_UMNL_8M_V_Thru
designator J?, comment 643410-1
Connector, Universal Mate-N-Lok, 8 Position, Male, Vertical, Through Hole; Manufacturer: TE Connectivity; Outset P/N: 0000086; Manufacturer P/N: 643410-1
footprint 643410-1 (Connector, Universal Mate-N-Lok, 8-Pin, Male, Vertical, Through-hole)
pins: 1, 2, 3, 4, 5, 6, 7, 8

## Con_USB_Type-A_RA_Thru
designator J?, comment UE27AC54100
Connector, USB, Type A, Right Angle, Thru-Hole; Manufacturer: Amphenol; Outset P/N: 0000087; Manufacturer P/N: UE27AC54100
signal-integrity model USB1.1
footprint UE27AC54100 (Connector; USB1.1, Reverse Type, Thru-Hole; 4 Position; Right Angle)
pins: 1 VBUS (power) "Power", 2 D- (in) "-DATA", 3 D+ (in) "+DATA", 4 GND (power) "Ground", 5 SHLD "Shield", 6 SHLD "Shield"

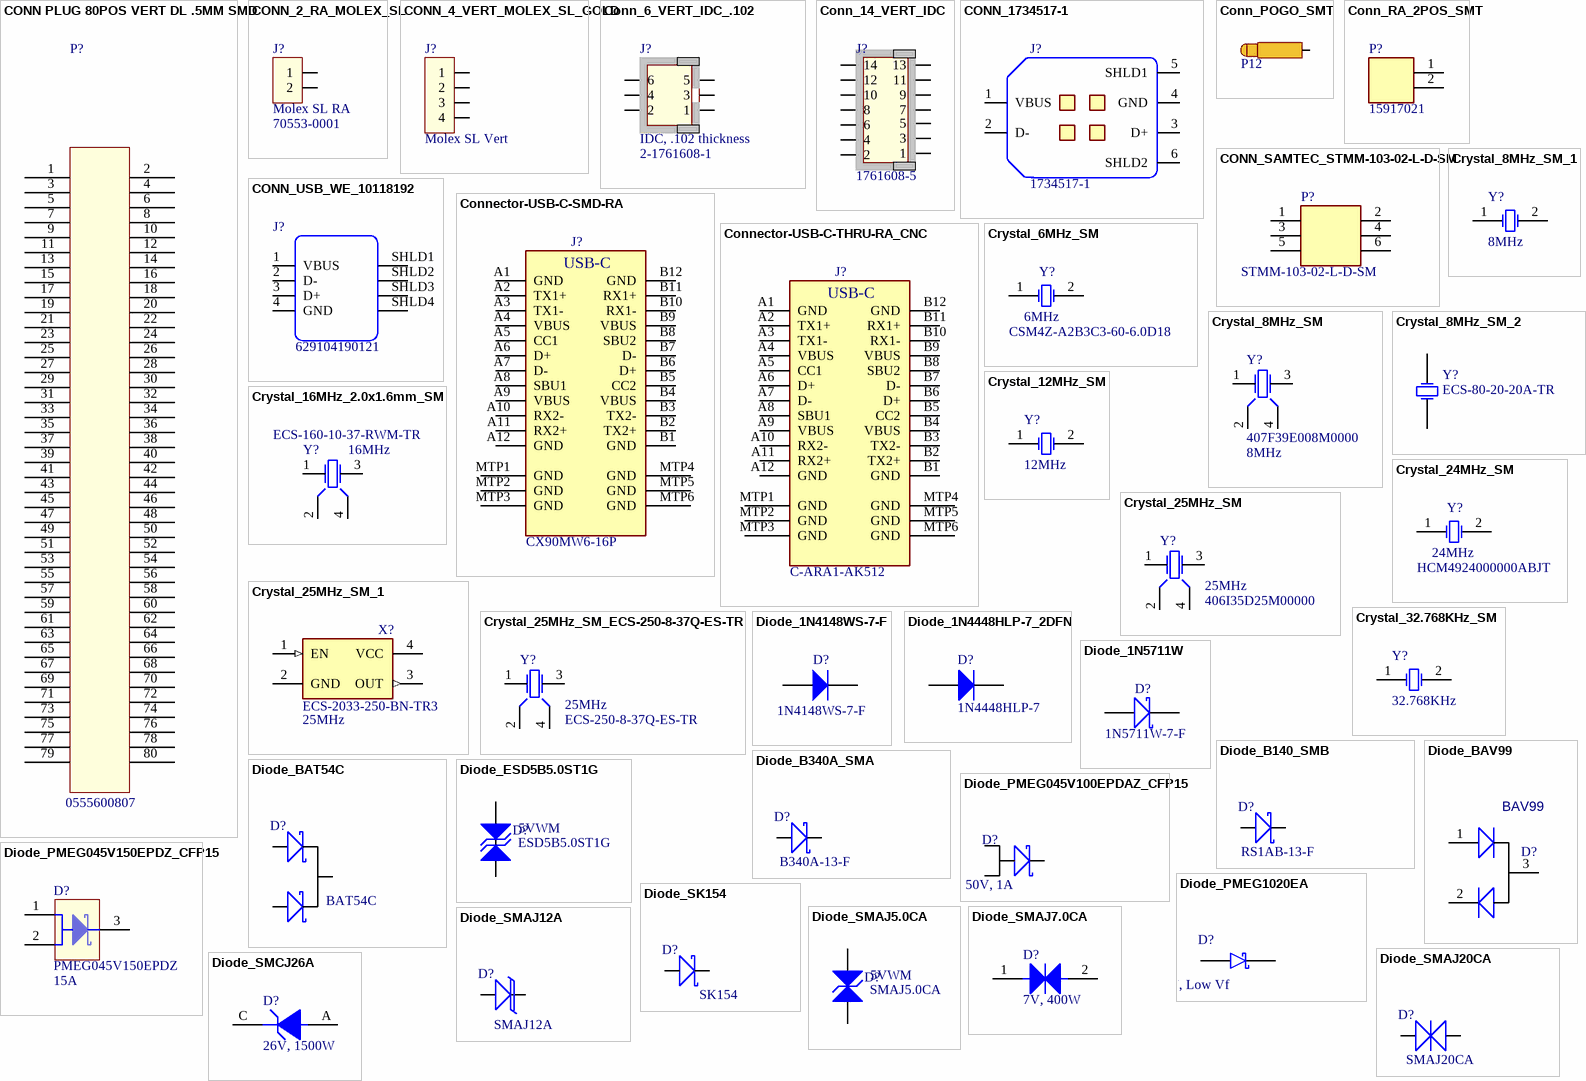
[diagram p11: symbols CONN PLUG 80POS VERT DL .5MM SMD to Diode_SMCJ26A]

## CONN PLUG 80POS VERT DL .5MM SMD
designator P?  Manufacturer P/N: 0555600807
CONN PLUG 80POS VERT DL .5MM SMD; Manufacturer: Molex; Outset P/N: PN-0003748
footprint 055560-0807 (CONN PLUG 80POS VERT DL .5MM SMD)
pins: 1, 2, 3, 4, 5, 6, 7, 8, 9, 10, 11, 12, 13, 14, 15, 16, 17, 18, 19, 20, 21, 22, 23, 24, 25, 26, 27, 28, 29, 30, 31, 32, 33, 34, 35, 36, 37, 38, 39, 40, 41, 42, 43, 44, 45, 46, 47, 48, 49, 50, 51, 52, 53, 54, 55, 56, 57, 58, 59, 60, 61, 62, 63, 64, 65, 66, 67, 68, 69, 70, 71, 72, 73, 74, 75, 76, 77, 78, 79, 80

## CONN_2_RA_MOLEX_SL
designator J?, comment Manufacturer P/N: 70553-0001  (hidden comment: Molex SL RA)
CONN_2_RA_MOLEX SL; Outset P/N: PN-0001801; Supplier 1: Digi-Key; Supplier Part Number 1: WM4900-ND; Manufacturer: Molex; Value: Molex SL RA
footprint 70553-0001 (Footprint not found)
pins: 1, 2

## CONN_4_VERT_MOLEX_SL_GOLD
designator J?, comment Molex SL Vert
CONN_4_VERT_MOLEX SL GOLD; Manufacturer P/N: 70543-0003; Outset P/N: PN-0001804; Supplier 1: Digi-Key; Supplier Part Number 1: WM4802-ND; Manufacturer: Molex; Value: Molex SL Vert
footprint 70543-0108
pins: 1, 2, 3, 4

## Conn_6_VERT_IDC_.102
designator J?, comment Manufacturer P/N: 2-1761608-1  (hidden comment: IDC, .102 thickness)
Conn_6_VERT_IDC_.102 board thickness; Manufacturer: TE; Outset P/N: PN-0002156; Supplier 1: Digi-Key; Supplier Part Number 1: A101794-ND; Value: IDC, .102 thickness
footprint 2-1761608-1 (6 Positions Header, Shrouded Connector 0.100" (2.54mm) Through Hole Gold)
pins: 1, 2, 3, 4, 5, 6

## Conn_14_VERT_IDC
designator J?, comment Manufacturer P/N: 1761608-5  (hidden comment: IDC, .102 thickness)
Conn_14_VERT_IDC; Manufacturer: TE; Supplier 1: Digi-Key; Supplier Part Number 1: A31184-ND; Value: IDC, .102 thickness
footprint 2-1761608-5 (14 Positions Header, Shrouded Connector 0.100" (2.54mm) Through Hole Gold)
pins: 1, 2, 3, 4, 5, 6, 7, 8, 9, 10, 11, 12, 13, 14

## CONN_1734517-1
designator J?, comment 1734517-1
CONN RCPT 4POS USB VERT GOLD SMD; Manufacturer: TE; Outset P/N: PN-0002769; Supplier 1: Digi-Key; Supplier Part Number 1: A111053CT-ND; Manufacturer P/N: 1734517-1; Value: 1734517-1
footprint CONN_USB_TE_1734517-1 (USB TYPE B FEMALE VERT SMT)
pins: 1 VBUS, 2 D-, 3 D+, 4 GND, 5 SHLD1, 6 SHLD2

## Conn_POGO_SMT
designator P12, comment 0910-2-57-20-75-14-11-0  (value not drawn)
POGO-PIN SPRING LOADED SMD GOLD; MFG: Mill-Max; CURRENT: 2A; Outset P/N: PN-0002500; TEMPERATURE: -55°C ~ 125°C; MFG_PART_NO: 0910-2-57-20-75-14-11-0; VALUE: 0910-2-57-20-75-14-11-0
footprint CON_POGO_SMT_1.83MM
pins: 1

## Conn_RA_2POS_SMT
designator P?, comment 15917021
Connector Header Surface Mount, Right Angle 2 position 0.100" (2.54mm); MFG: Molex; Outset P/N: PN-0008347; TEMPERATURE: -40°C ~ 105°C; MFG_PART_NO: 15917021; VALUE: 15917021
footprint CONN_MOLEX_15917021
pins: 1, 2

## CONN_SAMTEC_STMM-103-02-L-D-SM
designator P?, comment STMM-103-02-L-D-SM
CONN HEADER SMD 6POS 2MM; Manufacturer P/N: STMM-103-02-L-D-SM-K; Manufacturer: Samtec; Outset P/N: PN-0008337; TEMPERATURE: -55°C ~ 125°C; VALUE: STMM-103-02-L-D-SM
footprint CONN_SAMTEC_STMM-103-02-L-D-SM
pins: 1, 2, 3, 4, 5, 6

## CONN_USB_WE_10118192
designator J?, comment 629104190121
WR-COM USB TYPE A HORIZONTAL SMT; Manufacturer: Wurth Electronics; Outset P/N: PN-0002790; Manufacturer P/N: 629104190121; Supplier 1: Digi-Key; Supplier Part Number 1: 732-11179-1-ND; Value: 629104190121
footprint CONN_USB_WE_629104190121 (WR-COM USB TYPE A HORIZONTAL SMT)
pins: 1 VBUS, 2 D-, 3 D+, 4 GND, SHLD1, SHLD2, SHLD3, SHLD4

## Connector-USB-C-SMD-RA
designator J?, comment CX90MW6-16P
Manufacturer: Hirose Electric Co Ltd; Outset P/N: PN-0008201; Value: CX90MW6-16P
pins: A1 GND, A2 TX1+, A3 TX1-, A4 VBUS, A5 CC1, A6 D+, A7 D-, A8 SBU1, A9 VBUS, A10 RX2-, A11 RX2+, A12 GND, B1 GND, B2 TX2+, B3 TX2-, B4 VBUS, B5 CC2, B6 D+, B7 D-, B8 SBU2, B9 VBUS, B10 RX1-, B11 RX1+, B12 GND, MTP1 GND, MTP2 GND, MTP3 GND, MTP4 GND, MTP5 GND, MTP6 GND
text: USB-C

## Connector-USB-C-THRU-RA_CNC
designator J?, comment C-ARA1-AK512
Manufacturer: CNC Tech; Outset P/N: PN-0008401; Value: C-ARA1-AK512
footprint CONN_USB_C-ARA1-AK512 (USB-C (USB TYPE-C) USB 3.2 Gen 1 (USB 3.1 Gen 1, Superspeed (USB 3.0)) Receptacle Connector 24 Position Surface Mount, Right Angle; Through Hole)
pins: A1 GND, A2 TX1+, A3 TX1-, A4 VBUS, A5 CC1, A6 D+, A7 D-, A8 SBU1, A9 VBUS, A10 RX2-, A11 RX2+, A12 GND, B1 GND, B2 TX2+, B3 TX2-, B4 VBUS, B5 CC2, B6 D+, B7 D-, B8 SBU2, B9 VBUS, B10 RX1-, B11 RX1+, B12 GND, MTP1 GND, MTP2 GND, MTP3 GND, MTP4 GND, MTP5 GND, MTP6 GND
text: USB-C

## Crystal_6MHz_SM
designator Y?, comment Manufacturer P/N: CSM4Z-A2B3C3-60-6.0D18  (hidden comment: 6MHz)
Crystal, 6MHz ±30ppm, 18pF, 60 Ohm, HC-49S, Surface Mount; Manufacturer: Cardinal; Outset P/N: PN-0001697; Value: 6MHz
footprint XTAL_6MHz_HC49S_CSM4 (Cardinal, CSM4, HC49S SMD)
pins: 1 OSC1, 2 OSC2

## Crystal_8MHz_SM
designator Y?, comment Manufacturer P/N: 407F39E008M0000  (hidden comment: 8MHz)
Crystal, 8.0000MHZ, 20pF SMD; Manufacturer: CTS-Frequency Controls; Outset P/N: PN-0007147; VALUE: 8MHz
footprint XTAL_CTS_407
pins: 1, 2, 3, 4

## Crystal_8MHz_SM_1
designator Y?, comment 8MHz
Crystal Oscillator, 8MHz, 20pF, Surface Mount; Manufacturer: ECS Inc; Manufacturer P/N: ECS-80-20-20A-TR; Outset P/N: 0000090
footprint CSM-8A
pins: 1 OSC1, 2 OSC2

## Crystal_8MHz_SM_2
designator Y?, comment MFG_PART_NO: ECS-80-20-20A-TR  (hidden comment: 8MHz)
CRYSTAL 8.0000MHZ 20PF SMD; TOLERANCE: ±30ppm; MFG: ECS; Outset P/N: 0000090; TEMPERATURE: -10°C ~ 70°C; Value: 8MHz
footprint XTAL700X500X170D700L125X200N
pins: 1, 2

## Crystal_12MHz_SM
designator Y?, comment 12MHz
Crystal Oscillator, 12MHz, 20pF, Surface Mount; Manufacturer: ECS Inc; Manufacturer P/N: ECS-120-20-20A-TR; Outset P/N: 0000088
footprint CSM-8A
pins: 1 OSC1, 2 OSC2

## Crystal_16MHz_2.0x1.6mm_SM
designator Y?, comment Manufacturer P/N: ECS-160-10-37-RWM-TR  (hidden comment: 16MHz)
Crystal, 16MHz ±15ppm, 10pF, 2.0x1.6mm, Surface Mount; Manufacturer: ECS; Value: 16MHz
footprint XTAL_2.0x1.6mm (Crystal, 2.0 x 1.6 mm)
pins: 1, 2, 3, 4

## Crystal_24MHz_SM
designator Y?, comment Manufacturer P/N: HCM4924000000ABJT  (hidden comment: 24MHz)
Crystal, 24MHz ±30ppm, 18pF, 50 Ohm, HC49/US, Surface Mount; Manufacturer: Citizen Finedevice Co Ltd; Outset P/N: PN-0002779; Value: 24MHz
footprint XTAL1140X470X430N (Crystal;11.40mm L X 4.70mm W X 4.30mm H)
pins: 1 OSC1, 2 OSC2